# Altium footprint library IC.PcbLib: 163 footprints (part 3 of 11)
Each footprint in its own frame and in the unit in brackets; x right, y up, seen from the top. Pads: shape width x height; smd on the part's side, far side on the other; paste and mask are expansions set on the pad; w line width, h text height; cw(c..) or ccw(c..) is an arc to the next point about the centre after c.
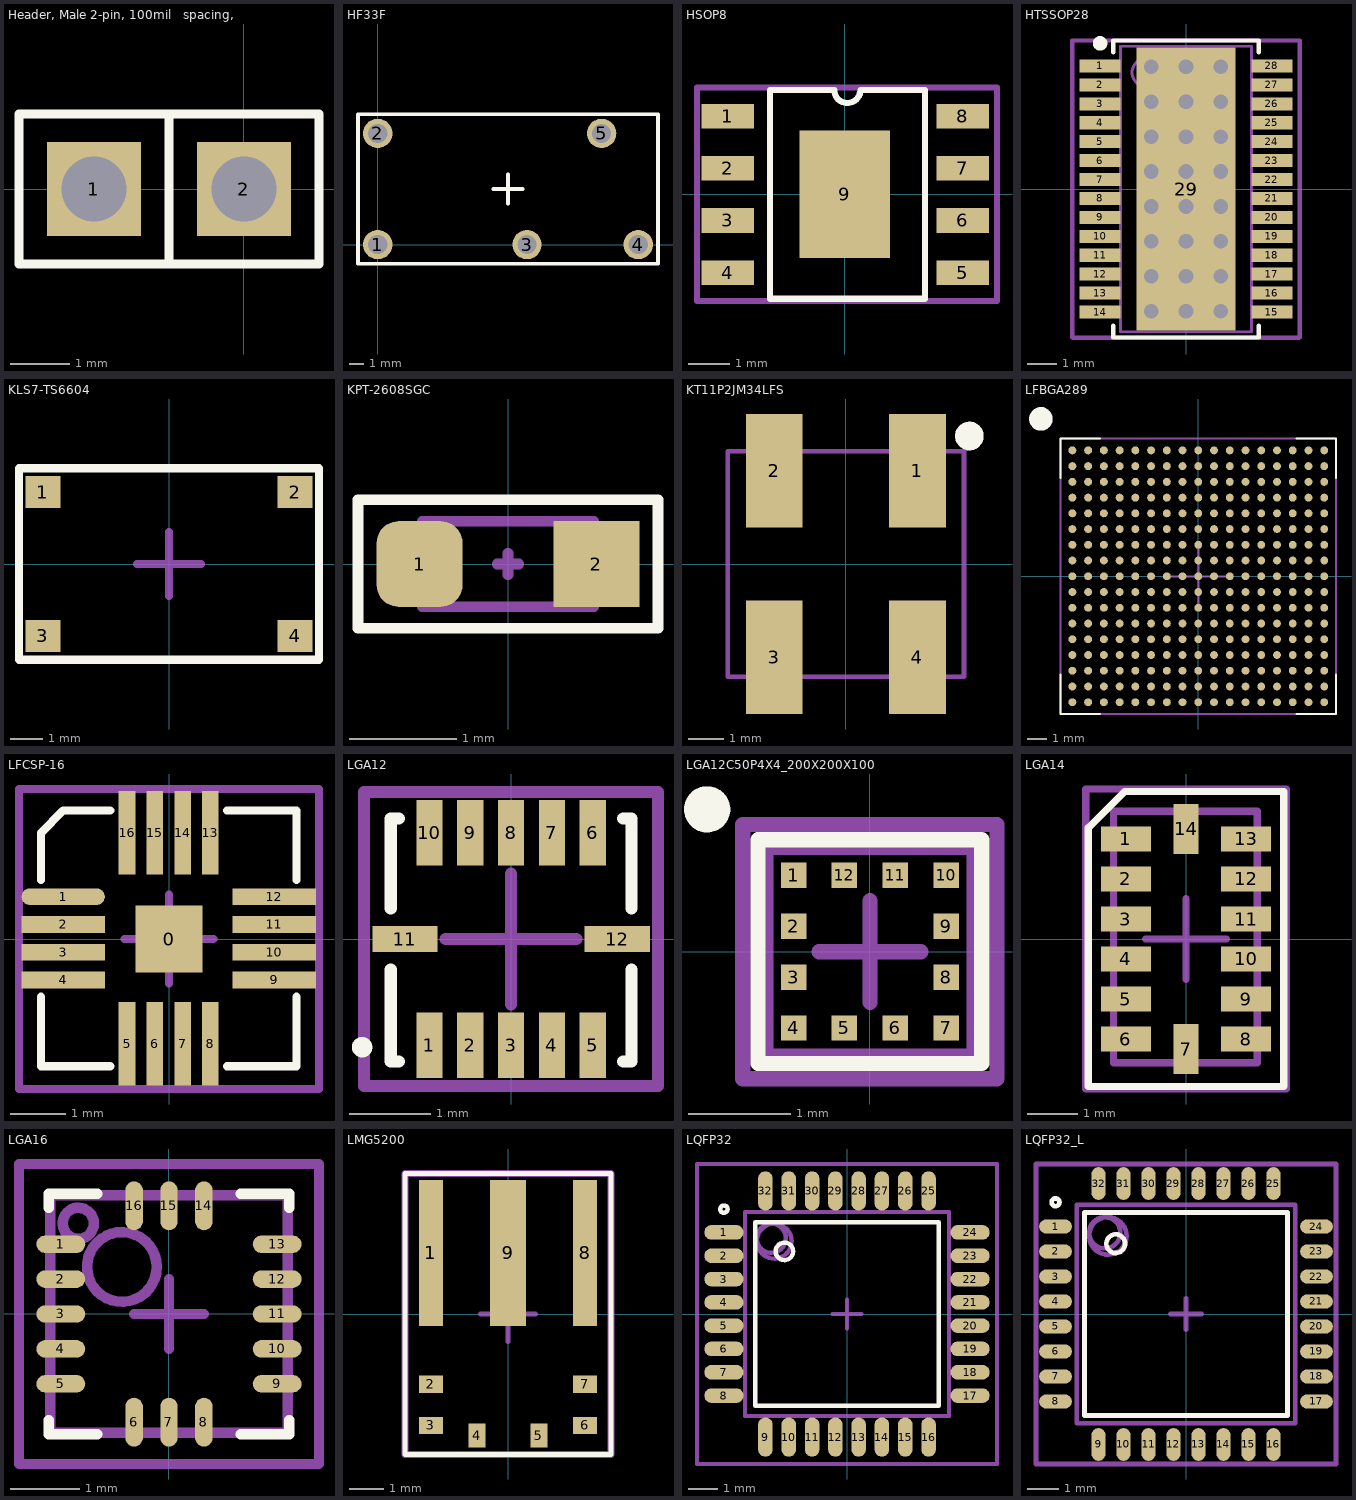
[diagram p2: the footprints below, top view; thin cyan lines are the x and y axes]

## Header, Male 2-pin, 100mil   spacing, [mm]
pads (2):
  rect 1.6x1.6 hole 1.1: 1(-2.54,0) 2(0,0)
Top Overlay:
  lines w0.15: -1.27,-1.27 1.27,-1.27 1.27,1.27 -1.27,1.27 ; -1.27,-1.27 -1.27,1.27 ; -1.27,-1.27 -1.27,1.27 ; -1.27,-1.27 -3.81,-1.27 -3.81,1.27 -1.27,1.27
3D body "PLS-1.STEP": height 8.5, standoff -3, extent -1.27,-1.27 1.27,1.27
3D body "PLS-1.STEP": height 8.5, standoff -3, extent -3.81,-1.27 -1.27,1.27

## HF33F [mm]
pads (5):
  round 2 hole 1.3: 1(0,0) 2(0,7.6) 3(10.2,0) 4(17.8,0) 5(15.3,7.6)
Top Overlay:
  lines w0.254: 7.9,3.8 8.9,3.8 ; 8.9,2.8 8.9,3.8 ; 8.9,4.8 8.9,3.8 ; 9.9,3.8 8.9,3.8 ; 8.9,3.8 8.9,3.8 ; -1.35,-1.3 -1.35,8.9 19.15,8.9 19.15,-1.3 -1.35,-1.3
Mechanical 1:
  lines w0.254: 8.9,3.8 8.9,3.8 ; 8.9,3.8 8.9,3.8 ; 8.9,3.8 8.9,3.8
3D body: height 15.3, standoff 0.5, extent -1.35,-1.3 19.15,8.9
3D body: height 2, standoff -2, extent 14.9,7.201 15.697,7.999
3D body: height 2, standoff -2, extent -0.4,7.201 0.397,7.999
3D body: height 2, standoff -2, extent 17.403,-0.399 18.2,0.399
3D body: height 2, standoff -2, extent 9.803,-0.399 10.6,0.399
3D body: height 2, standoff -2, extent -0.397,-0.399 0.4,0.399

## HSOP8 [mm]
pads (9):
  rect 1.27x0.6 smd: 1(-2.85,1.9) 2(-2.85,0.63) 3(-2.85,-0.64) 4(-2.85,-1.91) 5(2.866,-1.91) 6(2.866,-0.64) 7(2.866,0.63) 8(2.866,1.9)
  rect 2.2x3.1 all layers, no hole: 9(0,0)
Top Overlay:
  lines w0.15: -1.825,-2.545 -1.825,2.535 -0.259,2.535 ccw(c0.058,2.535) 0.376,2.535 1.95,2.535 1.95,-2.545 -1.825,-2.545
Mechanical 15:
  lines w0.15: -0.8,0 0,0 ; 0,-0.8 0,0 ; 0,0.8 0,0 ; 0.8,0 0,0 ; -3.6,-2.6 3.7,-2.6 3.7,2.6 -3.6,2.6 -3.6,-2.6
3D body "User Library-HSOP8.STEP": height 1.75, standoff 0, extent -3.05,-2.5 3.15,2.5

## HTSSOP28 [mm] "HTSSOP-28, 28-Leads, Body 9,70x4,40mm, Pitch 0,65mm, Thermal Pad 9,70x3,40mm, IPC Medium Density"
height 1.2
pads (29):
  rect 1.4x0.45 smd: 1(-2.95,4.225) 2(-2.95,3.575) 3(-2.95,2.925) 4(-2.95,2.275) 5(-2.95,1.625) 6(-2.95,0.975) 7(-2.95,0.325) 8(-2.95,-0.325) 9(-2.95,-0.975) 10(-2.95,-1.625) 11(-2.95,-2.275) 12(-2.95,-2.925) 13(-2.95,-3.575) 14(-2.95,-4.225) 15(2.95,-4.225) 16(2.95,-3.575) 17(2.95,-2.925) 18(2.95,-2.275) 19(2.95,-1.625) 20(2.95,-0.975) 21(2.95,-0.325) 22(2.95,0.325) 23(2.95,0.975) 24(2.95,1.625) 25(2.95,2.275) 26(2.95,2.925) 27(2.95,3.575) 28(2.95,4.225)
  rect 3.4x9.7 smd mask+0: 29(0,0)
via 1.2,3 diameter 1 hole 0.5
via 1.2,4.2 diameter 1 hole 0.5
via 0,4.2 diameter 1 hole 0.5
via -1.2,4.2 diameter 1 hole 0.5
via -1.2,3 diameter 1 hole 0.5
via 0,3 diameter 1 hole 0.5
via 1.2,0.6 diameter 1 hole 0.5
via 1.2,1.8 diameter 1 hole 0.5
via 0,1.8 diameter 1 hole 0.5
via -1.2,1.8 diameter 1 hole 0.5
via -1.2,0.6 diameter 1 hole 0.5
via 0,0.6 diameter 1 hole 0.5
via -1.2,-4.2 diameter 1 hole 0.5
via -1.2,-3 diameter 1 hole 0.5
via -1.2,-1.8 diameter 1 hole 0.5
via -1.2,-0.6 diameter 1 hole 0.5
via 1.2,-0.6 diameter 1 hole 0.5
via 1.2,-1.8 diameter 1 hole 0.5
via 1.2,-3 diameter 1 hole 0.5
via 1.2,-4.2 diameter 1 hole 0.5
via 0,-4.2 diameter 1 hole 0.5
via 0,-3 diameter 1 hole 0.5
via 0,-1.8 diameter 1 hole 0.5
via 0,-0.6 diameter 1 hole 0.5
Top Overlay:
  circle w0.25: c-2.95,5 r0.125
  lines w0.15: -2.5,-4.7 -2.5,-5.1 2.5,-5.1 2.5,-4.7 ; -2.5,4.7 -2.5,5.1 2.5,5.1 2.5,4.7
Top Solder:
  rectangle: -1.8,-2.6 1.8,2.6
Mechanical 2:
  circle w0.1: c-1.35,4 r0.5
  lines w0.1: -2.25,-4.9 -2.25,4.9 2.25,4.9 2.25,-4.9 -2.25,-4.9
Mechanical 4:
  lines w0.05: -3.9,-5.15 -3.9,5.15 3.9,5.15 3.9,-5.15 -3.9,-5.15
  lines w0.1: -0.5,0 0.5,0 ; 0,-0.5 0,0.5
Mechanical 15:
  lines w0.15: -0.8,0 0,0 ; 0,-0.8 0,0 ; 0,0.8 0,0 ; 0.8,0 0,0 ; -3.9,-5.1 3.9,-5.1 3.9,5.1 -3.9,5.1 -3.9,-5.1
3D body: height 1.2, standoff 0, extent -3.2,-4.9 3.2,4.9

## KLS7-TS6604 [mm] "Button"
pads (4):
  rect 1.1x1 smd: 1(-3.95,2.25) 2(3.95,2.25) 3(-3.95,-2.25) 4(3.95,-2.25)
Top Overlay:
  lines w0.254: -4.7,-3 0,-3 4.7,-3 4.7,0 4.7,3 0,3 -4.7,3 -4.7,0 -4.7,-3
Mechanical 15:
  lines w0.254: -1,0 0,0 ; 0,-1 0,0 ; 0,1 0,0 ; 1,0 0,0
3D body: height 3.6, standoff 0.1, extent -3,-3 3,3
3D body: height 8, standoff 3.7, extent -1.75,-1.75 1.75,1.75
3D body: height 3.7, standoff 3.6, extent -3,-3 3,3
3D body: height 4.1, standoff 3.7, extent -2.894,-2.898 -1.4,-1.401
3D body: height 4.1, standoff 3.7, extent 1.401,-2.894 2.898,-1.4
3D body: height 4.1, standoff 3.7, extent 1.4,1.401 2.894,2.898
3D body: height 4.1, standoff 3.7, extent -2.898,1.4 -1.401,2.894
3D body: height 0.15, standoff 0, extent -4,-2.6 -3.4,-1.9
3D body: height 0.15, standoff 0, extent 3.4,-2.6 4,-1.9
3D body: height 0.15, standoff 0, extent 3.4,1.9 4,2.6
3D body: height 0.15, standoff 0, extent -4,1.9 -3.4,2.6
3D body: height 1.5, standoff 0, extent -3.4,1.9 -3,2.6
3D body: height 1.5, standoff 0, extent 3,1.9 3.4,2.6
3D body: height 1.5, standoff 0, extent -3.4,-2.6 -3,-1.9
3D body: height 1.5, standoff 0, extent 3,-2.6 3.4,-1.9

## KPT-2608SGC [mm]
pads (2):
  rrect50% 0.8x0.8 smd: 1(-0.825,0)
  rect 0.8x0.8 smd: 2(0.825,0)
Top Overlay:
  lines w0.1: -1.4,-0.6 -1.4,0.6 1.4,0.6 1.4,-0.6 -1.4,-0.6
Mechanical 32:
  lines w0.1: -0.1,0 0.1,0 ; 0,-0.1 0,0.1 ; -0.8,-0.4 -0.8,0.4 0.8,0.4 0.8,-0.4 -0.8,-0.4
3D body: height 0.35, standoff 0.1, extent -0.8,-0.4 0.8,0.4
3D body: height 0.75, standoff 0.35, extent -0.4,-0.25 0.4,0.25

## KT11P2JM34LFS [mm]
pads (4):
  rect 1.59x3.175 smd: 1(2,2.603) 2(-2,2.603) 3(-2,-2.602) 4(2,-2.602)
Top Overlay:
  circle w0.4: c3.45,3.575 r0.2
Mechanical 5:
  lines w0.127: -2.575,-3.15 -2.575,-3.825 -1.5,-3.825 -1.5,-3.15 ; -2.575,3.15 -2.575,3.825 -1.5,3.825 -1.5,3.15 ; 1.5,-3.15 1.5,-3.825 2.575,-3.825 2.575,-3.15 ; 1.5,3.15 1.5,3.825 2.575,3.825 2.575,3.15 ; -3.3,-3.15 3.3,-3.15 3.3,3.15 -3.3,3.15 -3.3,-3.15
3D body: height 3, standoff 0, extent -2.999,-2.999 2.999,3
3D body: height 5.36, standoff 3, extent -1.75,-1.647 1.749,1.852

## LFBGA289 [mm]
pads (289):
  round 0.4 smd: A1(-6.4,6.4) A2(-5.6,6.4) A3(-4.8,6.4) A4(-4,6.4) A5(-3.2,6.4) A6(-2.4,6.4) A7(-1.6,6.4) A8(-0.8,6.4) A9(0,6.4) A10(0.8,6.4) A11(1.6,6.4) A12(2.4,6.4) A13(3.2,6.4) A14(4,6.4) A15(4.8,6.4) A16(5.6,6.4) A17(6.4,6.4) B1(-6.4,5.6) B2(-5.6,5.6) B3(-4.8,5.6) B4(-4,5.6) B5(-3.2,5.6) B6(-2.4,5.6) B7(-1.6,5.6) B8(-0.8,5.6) B9(0,5.6) B10(0.8,5.6) B11(1.6,5.6) B12(2.4,5.6) B13(3.2,5.6) B14(4,5.6) B15(4.8,5.6) B16(5.6,5.6) B17(6.4,5.6) C1(-6.4,4.8) C2(-5.6,4.8) C3(-4.8,4.8) C4(-4,4.8) C5(-3.2,4.8) C6(-2.4,4.8) C7(-1.6,4.8) C8(-0.8,4.8) C9(0,4.8) C10(0.8,4.8) C11(1.6,4.8) C12(2.4,4.8) C13(3.2,4.8) C14(4,4.8) C15(4.8,4.8) C16(5.6,4.8) C17(6.4,4.8) D1(-6.4,4) D2(-5.6,4) D3(-4.8,4) D4(-4,4) D5(-3.2,4) D6(-2.4,4) D7(-1.6,4) D8(-0.8,4) D9(0,4) D10(0.8,4) D11(1.6,4) D12(2.4,4) D13(3.2,4) D14(4,4) D15(4.8,4) D16(5.6,4) D17(6.4,4) E1(-6.4,3.2) E2(-5.6,3.2) E3(-4.8,3.2) E4(-4,3.2) E5(-3.2,3.2) E6(-2.4,3.2) E7(-1.6,3.2) E8(-0.8,3.2) E9(0,3.2) E10(0.8,3.2) E11(1.6,3.2) E12(2.4,3.2) E13(3.2,3.2) E14(4,3.2) E15(4.8,3.2) E16(5.6,3.2) E17(6.4,3.2) F1(-6.4,2.4) F2(-5.6,2.4) F3(-4.8,2.4) F4(-4,2.4) F5(-3.2,2.4) F6(-2.4,2.4) F7(-1.6,2.4) F8(-0.8,2.4) F9(0,2.4) F10(0.8,2.4) F11(1.6,2.4) F12(2.4,2.4) F13(3.2,2.4) F14(4,2.4) F15(4.8,2.4) F16(5.6,2.4) F17(6.4,2.4) G1(-6.4,1.6) G2(-5.6,1.6) G3(-4.8,1.6) G4(-4,1.6) G5(-3.2,1.6) G6(-2.4,1.6) G7(-1.6,1.6) G8(-0.8,1.6) G9(0,1.6) G10(0.8,1.6) G11(1.6,1.6) G12(2.4,1.6) G13(3.2,1.6) G14(4,1.6) G15(4.8,1.6) G16(5.6,1.6) G17(6.4,1.6) H1(-6.4,0.8) H2(-5.6,0.8) H3(-4.8,0.8) H4(-4,0.8) H5(-3.2,0.8) H6(-2.4,0.8) H7(-1.6,0.8) H8(-0.8,0.8) H9(0,0.8) H10(0.8,0.8) H11(1.6,0.8) H12(2.4,0.8) H13(3.2,0.8) H14(4,0.8) H15(4.8,0.8) H16(5.6,0.8) H17(6.4,0.8) J1(-6.4,0) J2(-5.6,0) J3(-4.8,0) J4(-4,0) J5(-3.2,0) J6(-2.4,0) J7(-1.6,0) J8(-0.8,0) J9(0,0) J10(0.8,0) J11(1.6,0) J12(2.4,0) J13(3.2,0) J14(4,0) J15(4.8,0) J16(5.6,0) J17(6.4,0) K1(-6.4,-0.8) K2(-5.6,-0.8) K3(-4.8,-0.8) K4(-4,-0.8) K5(-3.2,-0.8) K6(-2.4,-0.8) K7(-1.6,-0.8) K8(-0.8,-0.8) K9(0,-0.8) K10(0.8,-0.8) K11(1.6,-0.8) K12(2.4,-0.8) K13(3.2,-0.8) K14(4,-0.8) K15(4.8,-0.8) K16(5.6,-0.8) K17(6.4,-0.8) L1(-6.4,-1.6) L2(-5.6,-1.6) L3(-4.8,-1.6) L4(-4,-1.6) L5(-3.2,-1.6) L6(-2.4,-1.6) L7(-1.6,-1.6) L8(-0.8,-1.6) L9(0,-1.6) L10(0.8,-1.6) L11(1.6,-1.6) L12(2.4,-1.6) L13(3.2,-1.6) L14(4,-1.6) L15(4.8,-1.6) L16(5.6,-1.6) L17(6.4,-1.6) M1(-6.4,-2.4) M2(-5.6,-2.4) M3(-4.8,-2.4) M4(-4,-2.4) M5(-3.2,-2.4) M6(-2.4,-2.4) M7(-1.6,-2.4) M8(-0.8,-2.4) M9(0,-2.4) M10(0.8,-2.4) M11(1.6,-2.4) M12(2.4,-2.4) M13(3.2,-2.4) M14(4,-2.4) M15(4.8,-2.4) M16(5.6,-2.4) M17(6.4,-2.4) N1(-6.4,-3.2) N2(-5.6,-3.2) N3(-4.8,-3.2) N4(-4,-3.2) N5(-3.2,-3.2) N6(-2.4,-3.2) N7(-1.6,-3.2) N8(-0.8,-3.2) N9(0,-3.2) N10(0.8,-3.2) N11(1.6,-3.2) N12(2.4,-3.2) N13(3.2,-3.2) N14(4,-3.2) N15(4.8,-3.2) N16(5.6,-3.2) N17(6.4,-3.2) P1(-6.4,-4) P2(-5.6,-4) P3(-4.8,-4) P4(-4,-4) P5(-3.2,-4) P6(-2.4,-4) P7(-1.6,-4) P8(-0.8,-4) P9(0,-4) P10(0.8,-4) P11(1.6,-4) P12(2.4,-4) P13(3.2,-4) P14(4,-4) P15(4.8,-4) P16(5.6,-4) P17(6.4,-4) R1(-6.4,-4.8) R2(-5.6,-4.8) R3(-4.8,-4.8) R4(-4,-4.8) R5(-3.2,-4.8) R6(-2.4,-4.8) R7(-1.6,-4.8) R8(-0.8,-4.8) R9(0,-4.8) R10(0.8,-4.8) R11(1.6,-4.8) R12(2.4,-4.8) R13(3.2,-4.8) R14(4,-4.8) R15(4.8,-4.8) R16(5.6,-4.8) R17(6.4,-4.8) T1(-6.4,-5.6) T2(-5.6,-5.6) T3(-4.8,-5.6) T4(-4,-5.6) T5(-3.2,-5.6) T6(-2.4,-5.6) T7(-1.6,-5.6) T8(-0.8,-5.6) T9(0,-5.6) T10(0.8,-5.6) T11(1.6,-5.6) T12(2.4,-5.6) T13(3.2,-5.6) T14(4,-5.6) T15(4.8,-5.6) T16(5.6,-5.6) T17(6.4,-5.6) U1(-6.4,-6.4) U2(-5.6,-6.4) U3(-4.8,-6.4) U4(-4,-6.4) U5(-3.2,-6.4) U6(-2.4,-6.4) U7(-1.6,-6.4) U8(-0.8,-6.4) U9(0,-6.4) U10(0.8,-6.4) U11(1.6,-6.4) U12(2.4,-6.4) U13(3.2,-6.4) U14(4,-6.4) U15(4.8,-6.4) U16(5.6,-6.4) U17(6.4,-6.4)
Top Overlay:
  circle w0.7: c-8,8 r0.25
  lines w0.1: -7,-5 -7,-7 -5,-7 ; -7,5 -7,7 -5,7 ; 5,-7 7,-7 7,-5 ; 5,7 7,7 7,5
Mechanical 32:
  lines w0.1: -1.6,0 1.6,0 ; 0,-1.6 0,1.6 ; -7,-7 7,-7 7,7 -7,7 -7,-7
3D body: height 1.52, standoff 0.1, extent -7,-7 7,7

## LFCSP-16 [mm]
pads (17):
  rect 1.2x1.2 smd: 0(0,0)
  oval 1.5x0.3 smd: 1(-1.905,0.762)
  rect 1.5x0.3 smd: 2(-1.905,0.262) 3(-1.905,-0.238) 4(-1.905,-0.738) 9(1.895,-0.738) 10(1.895,-0.238) 11(1.895,0.262) 12(1.895,0.762)
  rect 0.3x1.5 smd: 5(-0.755,-1.888) 6(-0.255,-1.888) 7(0.245,-1.888) 8(0.745,-1.888) 13(0.745,1.912) 14(0.245,1.912) 15(-0.255,1.912) 16(-0.755,1.912)
Top Overlay:
  lines w0.15: -2.305,-1.038 -2.305,-2.288 -1.055,-2.288 ; -2.305,1.062 -2.305,1.912 -1.905,2.312 -1.055,2.312 ; 1.045,-2.288 2.295,-2.288 2.295,-1.038 ; 1.045,2.312 2.295,2.312 2.295,1.062
  text "." at -1.855,1.837 h0.1
Mechanical 15:
  lines w0.15: -0.8,0 0,0 ; 0,-0.8 0,0 ; 0,0.8 0,0 ; 0.8,0 0,0 ; -2.7,-2.7 -2.7,2.7 2.7,2.7 2.7,-2.7 -2.7,-2.7
3D body: height 1, standoff 0, extent -2.1,-2.025 1.9,1.975

## LGA12 [mm]
height 0.9
pads (12):
  rect 0.32x0.8 smd: 1(-1,-1.3) 2(-0.5,-1.3) 3(0,-1.3) 4(0.5,-1.3) 5(1,-1.3) 6(1,1.3) 7(0.5,1.3) 8(0,1.3) 9(-0.5,1.3) 10(-1,1.3)
  rect 0.8x0.32 smd: 11(-1.3,0) 12(1.3,0)
Top Overlay:
  circle w0.15: c-1.825,-1.325 r0.05
  lines w0.15: -1.475,-0.375 -1.475,-1.5 -1.375,-1.5 ; -1.475,0.375 -1.475,1.475 -1.375,1.475 ; 1.375,-1.5 1.475,-1.5 1.475,-0.375 ; 1.375,1.475 1.475,1.475 1.475,0.375
Mechanical 15:
  lines w0.15: -0.8,0 0,0 ; 0,-0.8 0,0 ; 0,0.8 0,0 ; 0.8,0 0,0 ; -1.8,-1.8 1.8,-1.8 1.8,1.8 -1.8,1.8 -1.8,-1.8
3D body "LGA12.STEP": height 0.85, standoff 0, extent -1.5,-1.5 1.5,1.5

## LGA12C50P4X4_200X200X100 [mm] "LGA, 12-Leads, Body 2,00x2,00mmx1,00mm, Pitch 0,50mm"
height 1
pads (12):
  rect 0.25x0.25 smd: 1(-0.75,0.75) 2(-0.75,0.25) 3(-0.75,-0.25) 4(-0.75,-0.75) 5(-0.25,-0.75) 6(0.25,-0.75) 7(0.75,-0.75) 8(0.75,-0.25) 9(0.75,0.25) 10(0.75,0.75) 11(0.25,0.75) 12(-0.25,0.75)
Top Overlay:
  circle w0.254: c-1.6,1.4 r0.1
  lines w0.15: -1.1,-1.1 -1.1,1.1 1.1,1.1 1.1,-1.1 -1.1,-1.1
Mechanical 13:
  lines w0.1: -1,-1 -1,1 1,1 1,-1 -1,-1
Mechanical 15:
  lines w0.15: -0.5,0 0.5,0 ; 0,-0.5 0,0.5 ; -1.25,-1.25 -1.25,1.25 1.25,1.25 1.25,-1.25 -1.25,-1.25
3D body: height 1, standoff 0, extent -1.075,-1.075 1.075,1.075

## LGA14 [mm]
height 0.9
pads (14):
  rect 1x0.5 smd: 1(-1.2,2) 2(-1.2,1.2) 3(-1.2,0.4) 4(-1.2,-0.4) 5(-1.2,-1.2) 6(-1.2,-2) 8(1.2,-2) 9(1.2,-1.2) 10(1.2,-0.4) 11(1.2,0.4) 12(1.2,1.2) 13(1.2,2)
  rect 0.5x1 smd: 7(0,-2.2) 14(0,2.2)
Top Overlay:
  lines w0.15: -1.95,-2.95 1.95,-2.95 1.95,2.95 -1.225,2.95 -1.95,2.225 -1.95,-2.95
  text "." at -1.85,2.825 h0.1
Mechanical 15:
  lines w0.15: -0.8,0 0,0 ; 0,-0.8 0,0 ; 0,0.8 0,0 ; 0.8,0 0,0 ; -2,-3 2,-3 2,3 -2,3 -2,-3
Mechanical 29:
  circle w0.15: c-0.925,2.025 r0.141
  lines w0.15: -1.45,-2.475 -1.45,2.55 1.425,2.55 1.425,-2.475 -1.45,-2.475
  text ".Designator" at 0.4,-2.3 h1
3D body "LGA14.STEP": height 1.1, standoff 0, extent -1.475,-2.5 1.525,2.5

## LGA16 [mm] "PQFN, 16-Leads, Body 3x3mm, Pitch 0.5mm, IPC Medium Density"
height 1
pads (16):
  oval 0.7x0.25 smd: 1(-1.55,1) 2(-1.55,0.5) 3(-1.55,0) 4(-1.55,-0.5) 5(-1.55,-1) 9(1.55,-1) 10(1.55,-0.5) 11(1.55,0) 12(1.55,0.5) 13(1.55,1)
  oval 0.25x0.7 smd: 6(-0.5,-1.55) 7(0,-1.55) 8(0.5,-1.55) 14(0.5,1.55) 15(0,1.55) 16(-0.5,1.55)
Top Overlay:
  lines w0.15: -1.725,-1.525 -1.725,-1.725 -1.025,-1.725 ; -1.725,1.525 -1.725,1.725 -1.025,1.725 ; 1.025,-1.725 1.725,-1.725 1.725,-1.525 ; 1.025,1.725 1.725,1.725 1.725,1.525
  text "." at -2.125,1.475 h0.1
Mechanical 13:
  circle w0.15: c-0.675,0.675 r0.5
Mechanical 15:
  lines w0.15: -0.5,0 0.5,0 ; 0,-0.5 0,0.5 ; -2.15,-2.15 2.15,-2.15 2.15,2.15 -2.15,2.15 -2.15,-2.15
Mechanical 29:
  circle w0.15: c-1.3,1.3 r0.224
  lines w0.15: -1.7,-1.7 1.7,-1.7 1.7,1.7 -1.7,1.7 -1.7,-1.7
  text ".Designator" at -1.5,-0.5 h1
3D body: height 1, standoff 0, extent -1.575,-1.575 1.575,1.575

## LMG5200 [mm] "QFM 6?8 mm"
height 2
pads (9):
  rect 0.7x4.25 smd: 1(-2.25,1.78) 8(2.25,1.78)
  rect 0.7x0.5 smd: 2(-2.25,-2.05) 3(-2.25,-3.25) 6(2.25,-3.25) 7(2.25,-2.05)
  rect 0.5x0.7 smd: 4(-0.9,-3.55) 5(0.9,-3.55)
  rect 1.05x4.25 smd: 9(0,1.78)
Top Overlay:
  lines w0.15: -3,-4.1 0,-4.1 3,-4.1 3,0 3,4.1 0,4.1 -3,4.1 -3,0 -3,-4.1
  text "." at -2.775,4.55 h0.1
Mechanical 15:
  lines w0.15: -0.8,0 0,0 ; 0,-0.8 0,0 ; 0,0.8 0,0 ; 0.8,0 0,0 ; -3,-4.1 -3,4.1 3,4.1 3,-4.1 -3,-4.1
Mechanical 29:
  lines w0.2: -3,-4.1 0,-4.1 3,-4.1 3,0 3,4.1 0,4.1 -3,4.1 -3,0 -3,-4.1
  text ".Designator" at 0.3,-3.7 h1
3D body: height 2, standoff 0.05, extent -3,-4 3,4
3D body: height 6.76, standoff -6.76, extent 1.1,-1 1.1,-1

## LQFP32 [mm] "TQFP, 32-Leads, Body 7,00x7,00mm, Pitch 0,80mm, IPC Medium Density"
height 1.5
pads (32):
  oval 1.35x0.5 smd: 1(-4.225,2.8) 2(-4.225,2) 3(-4.225,1.2) 4(-4.225,0.4) 5(-4.225,-0.4) 6(-4.225,-1.2) 7(-4.225,-2) 8(-4.225,-2.8) 17(4.225,-2.8) 18(4.225,-2) 19(4.225,-1.2) 20(4.225,-0.4) 21(4.225,0.4) 22(4.225,1.2) 23(4.225,2) 24(4.225,2.8)
  oval 0.5x1.35 smd: 9(-2.8,-4.225) 10(-2,-4.225) 11(-1.2,-4.225) 12(-0.4,-4.225) 13(0.4,-4.225) 14(1.2,-4.225) 15(2,-4.225) 16(2.8,-4.225) 25(2.8,4.225) 26(2,4.225) 27(1.2,4.225) 28(0.4,4.225) 29(-0.4,4.225) 30(-1.2,4.225) 31(-2,4.225) 32(-2.8,4.225)
Top Overlay:
  circle w0.15: c-2.15,2.15 r0.3
  circle w0.15: c-4.225,3.6 r0.125
  lines w0.15: -3.15,-3.15 3.15,-3.15 3.15,3.15 -3.15,3.15 -3.15,-3.15
Mechanical 13:
  circle w0.15: c-2.6,2.6 r0.5
  lines w0.15: -3.5,-3.5 3.5,-3.5 3.5,3.5 -3.5,3.5 -3.5,-3.5
Mechanical 15:
  lines w0.15: -0.5,0 0.5,0 ; 0,-0.5 0,0.5 ; -5.15,-5.15 5.15,-5.15 5.15,5.15 -5.15,5.15 -5.15,-5.15
Mechanical 29:
  circle w0.15: c-2.5,2.5 r0.6
  lines w0.15: -3.5,-3.5 -3.5,3.5 3.5,3.5 3.5,-3.5 -3.5,-3.5
  text ".Designator" at -2.7,-0.3 h1
3D body: height 1.5, standoff 0.1, extent -3.5,-3.5 3.5,3.5

## LQFP32_L [mm] "TQFP, 32-Leads, Body 7,00x7,00mm, Pitch 0,80mm, IPC High Density"
height 1.5
pads (32):
  oval 1.05x0.45 smd: 1(-4.175,2.8) 2(-4.175,2) 3(-4.175,1.2) 4(-4.175,0.4) 5(-4.175,-0.4) 6(-4.175,-1.2) 7(-4.175,-2) 8(-4.175,-2.8) 17(4.175,-2.8) 18(4.175,-2) 19(4.175,-1.2) 20(4.175,-0.4) 21(4.175,0.4) 22(4.175,1.2) 23(4.175,2) 24(4.175,2.8)
  oval 0.45x1.05 smd: 9(-2.8,-4.175) 10(-2,-4.175) 11(-1.2,-4.175) 12(-0.4,-4.175) 13(0.4,-4.175) 14(1.2,-4.175) 15(2,-4.175) 16(2.8,-4.175) 25(2.8,4.175) 26(2,4.175) 27(1.2,4.175) 28(0.4,4.175) 29(-0.4,4.175) 30(-1.2,4.175) 31(-2,4.175) 32(-2.8,4.175)
Top Overlay:
  circle w0.15: c-4.175,3.575 r0.125
  circle w0.15: c-2.25,2.25 r0.3
  lines w0.15: -3.25,-3.25 -3.25,3.25 3.25,3.25 3.25,-3.25 -3.25,-3.25
Mechanical 13:
  circle w0.15: c-2.6,2.6 r0.5
  lines w0.15: -3.5,-3.5 -3.5,3.5 3.5,3.5 3.5,-3.5 -3.5,-3.5
Mechanical 15:
  lines w0.15: -0.5,0 0.5,0 ; 0,-0.5 0,0.5 ; -4.8,-4.8 -4.8,4.8 4.8,4.8 4.8,-4.8 -4.8,-4.8
Mechanical 29:
  circle w0.15: c-2.5,2.5 r0.6
  lines w0.15: -3.5,-3.5 3.5,-3.5 3.5,3.5 -3.5,3.5 -3.5,-3.5
  text ".Designator" at -2.6,-0.3 h1
3D body: height 1.5, standoff 0.1, extent -3.5,-3.5 3.5,3.5